# Altium integrated library Altium_WR-TBL_Rising Cage Clamp (rev25a).IntLib: 435 symbols (part 1 of 3) (continued)
## 691221320006 (continued)

## 691221320008
designator J?
WR-TBL Series 2213 55° Entry Modular, THT, pitch 3.81mm, 08p; Manufacturer: Wurth Elektronik; Modularity: Yes; Rated Current: 10A; System: Rising Cage Clamp; Working Voltage: 300V; Manufacturer Part Number: 691221320008; Category: Terminal Block; Match Code: WR-TBL; ComponentLink1Description: Website Link; ComponentLink1URL: https://www.we-online.com/redexpert/article/691221320008?ad; ComponentLink2Description: Datasheet Link; ComponentLink2URL: https://www.we-online.com/redexpert/spec/691221320008?ad; Mount: Through Hole; Min Operating Temperature: -40°C; Max Operating Temperature: 105°C; Packaging: Box; Application: Rising Cage Clamp; Number of Pins: 8; Number of Rows: 1; Orientation: 55°; Pitch: 3.81mm
footprint 691221320008
pins: 1, 2, 3, 4, 5, 6, 7, 8

## 691230110004
designator J?
WR-TBL Series 2301 Double Level Horizontal Entry Modular, THT, pitch 3.5mm, 04p; Manufacturer: Wurth Elektronik; Modularity: Yes; Rated Current: 10A; System: Rising Cage Clamp; Working Voltage: 300V; Manufacturer Part Number: 691230110004; Category: Terminal Block; Match Code: WR-TBL; ComponentLink1Description: Website Link; ComponentLink1URL: https://www.we-online.com/redexpert/article/691230110004?ad; ComponentLink2Description: Datasheet Link; ComponentLink2URL: https://www.we-online.com/redexpert/spec/691230110004?ad; Mount: Through Hole; Min Operating Temperature: -40°C; Max Operating Temperature: 105°C; Packaging: Box; Application: Rising Cage Clamp; Number of Pins: 4; Number of Rows: 2; Orientation: Double Level Horizontal; Pitch: 3.5mm
footprint 691230110004
pins: 1, 2, 3, 4

## 691230110006
designator J?
WR-TBL Series 2301 Double Level Horizontal Entry Modular, THT, pitch 3.5mm, 06p; Manufacturer: Wurth Elektronik; Modularity: Yes; Rated Current: 10A; System: Rising Cage Clamp; Working Voltage: 300V; Manufacturer Part Number: 691230110006; Category: Terminal Block; Match Code: WR-TBL; ComponentLink1Description: Website Link; ComponentLink1URL: https://www.we-online.com/redexpert/article/691230110006?ad; ComponentLink2Description: Datasheet Link; ComponentLink2URL: https://www.we-online.com/redexpert/spec/691230110006?ad; Mount: Through Hole; Min Operating Temperature: -40°C; Max Operating Temperature: 105°C; Packaging: Box; Application: Rising Cage Clamp; Number of Pins: 6; Number of Rows: 2; Orientation: Double Level Horizontal; Pitch: 3.5mm
footprint 691230110006
pins: 1, 2, 3, 4, 5, 6

## 691230310004
designator J?
WR-TBL Series 2303 Double Level Horizontal Entry Modular, THT, pitch 3.81mm, 04p; Manufacturer: Wurth Elektronik; Modularity: Yes; Rated Current: 10A; System: Rising Cage Clamp; Working Voltage: 300V; Manufacturer Part Number: 691230310004; Category: Terminal Block; Match Code: WR-TBL; ComponentLink1Description: Website Link; ComponentLink1URL: https://www.we-online.com/redexpert/article/691230310004?ad; ComponentLink2Description: Datasheet Link; ComponentLink2URL: https://www.we-online.com/redexpert/spec/691230310004?ad; Mount: Through Hole; Min Operating Temperature: -40°C; Max Operating Temperature: 105°C; Packaging: Box; Application: Rising Cage Clamp; Number of Pins: 4; Number of Rows: 2; Orientation: Double Level Horizontal; Pitch: 3.81mm
footprint 691230310004
pins: 1, 2, 3, 4

## 691230310006
designator J?
WR-TBL Series 2303 Double Level Horizontal Entry Modular, THT, pitch 3.81mm, 06p; Manufacturer: Wurth Elektronik; Modularity: Yes; Rated Current: 10A; System: Rising Cage Clamp; Working Voltage: 300V; Manufacturer Part Number: 691230310006; Category: Terminal Block; Match Code: WR-TBL; ComponentLink1Description: Website Link; ComponentLink1URL: https://www.we-online.com/redexpert/article/691230310006?ad; ComponentLink2Description: Datasheet Link; ComponentLink2URL: https://www.we-online.com/redexpert/spec/691230310006?ad; Mount: Through Hole; Min Operating Temperature: -40°C; Max Operating Temperature: 105°C; Packaging: Box; Application: Rising Cage Clamp; Number of Pins: 6; Number of Rows: 2; Orientation: Double Level Horizontal; Pitch: 3.81mm
footprint 691230310006
pins: 1, 2, 3, 4, 5, 6

## 691231510004
designator J?
WR-TBL Series 2315 Double Level Horizontal Entry Modular, THT, pitch 5.08mm, 04p; Manufacturer: Wurth Elektronik; Modularity: Yes; Rated Current: 10A; System: Rising Cage Clamp; Working Voltage: 300V; Manufacturer Part Number: 691231510004; Category: Terminal Block; Match Code: WR-TBL; ComponentLink1Description: Website Link; ComponentLink1URL: https://www.we-online.com/redexpert/article/691231510004?ad; ComponentLink2Description: Datasheet Link; ComponentLink2URL: https://www.we-online.com/redexpert/spec/691231510004?ad; Mount: Through Hole; Min Operating Temperature: -40°C; Max Operating Temperature: 105°C; Packaging: Box; Application: Rising Cage Clamp; Number of Pins: 4; Number of Rows: 2; Orientation: Double Level Horizontal; Pitch: 5.08mm
footprint 691231510004
pins: 1, 2, 3, 4

## 691231510006
designator J?
WR-TBL Series 2315 Double Level Horizontal Entry Modular, THT, pitch 5.08mm, 06p; Manufacturer: Wurth Elektronik; Modularity: Yes; Rated Current: 10A; System: Rising Cage Clamp; Working Voltage: 300V; Manufacturer Part Number: 691231510006; Category: Terminal Block; Match Code: WR-TBL; ComponentLink1Description: Website Link; ComponentLink1URL: https://www.we-online.com/redexpert/article/691231510006?ad; ComponentLink2Description: Datasheet Link; ComponentLink2URL: https://www.we-online.com/redexpert/spec/691231510006?ad; Mount: Through Hole; Min Operating Temperature: -40°C; Max Operating Temperature: 105°C; Packaging: Box; Application: Rising Cage Clamp; Number of Pins: 6; Number of Rows: 2; Orientation: Double Level Horizontal; Pitch: 5.08mm
footprint 691231510006
pins: 1, 2, 3, 4, 5, 6

## 691231710004
designator J?
WR-TBL Series 2317 Double Level Horizontal Entry Modular, THT, pitch 5mm, 04p; Manufacturer: Wurth Elektronik; Modularity: Yes; Rated Current: 10A; System: Rising Cage Clamp; Working Voltage: 300V; Manufacturer Part Number: 691231710004; Category: Terminal Block; Match Code: WR-TBL; ComponentLink1Description: Website Link; ComponentLink1URL: https://www.we-online.com/redexpert/article/691231710004?ad; ComponentLink2Description: Datasheet Link; ComponentLink2URL: https://www.we-online.com/redexpert/spec/691231710004?ad; Mount: Through Hole; Min Operating Temperature: -40°C; Max Operating Temperature: 105°C; Packaging: Box; Application: Rising Cage Clamp; Number of Pins: 4; Number of Rows: 2; Orientation: Double Level Horizontal; Pitch: 5mm
footprint 691231710004
pins: 1, 2, 3, 4

## 691231710006
designator J?
WR-TBL Series 2317 Double Level Horizontal Entry Modular, THT, pitch 5mm, 06p; Manufacturer: Wurth Elektronik; Modularity: Yes; Rated Current: 10A; System: Rising Cage Clamp; Working Voltage: 300V; Manufacturer Part Number: 691231710006; Category: Terminal Block; Match Code: WR-TBL; ComponentLink1Description: Website Link; ComponentLink1URL: https://www.we-online.com/redexpert/article/691231710006?ad; ComponentLink2Description: Datasheet Link; ComponentLink2URL: https://www.we-online.com/redexpert/spec/691231710006?ad; Mount: Through Hole; Min Operating Temperature: -40°C; Max Operating Temperature: 105°C; Packaging: Box; Application: Rising Cage Clamp; Number of Pins: 6; Number of Rows: 2; Orientation: Double Level Horizontal; Pitch: 5mm
footprint 691231710006
pins: 1, 2, 3, 4, 5, 6

## 691232510004
designator J?
WR-TBL Series 2325 Double Level Horizontal Entry Modular, THT, pitch 5.08mm, 04p; Manufacturer: Wurth Elektronik; Modularity: Yes; Rated Current: 20A; System: Rising Cage Clamp; Working Voltage: 300V; Manufacturer Part Number: 691232510004; Category: Terminal Block; Match Code: WR-TBL; ComponentLink1Description: Website Link; ComponentLink1URL: https://www.we-online.com/redexpert/article/691232510004?ad; ComponentLink2Description: Datasheet Link; ComponentLink2URL: https://www.we-online.com/redexpert/spec/691232510004?ad; Mount: Through Hole; Min Operating Temperature: -40°C; Max Operating Temperature: 105°C; Packaging: Box; Application: Rising Cage Clamp; Number of Pins: 4; Number of Rows: 2; Orientation: Double Level Horizontal; Pitch: 5.08mm
footprint 691232510004
pins: 1, 2, 3, 4

## 691232510006
designator J?
WR-TBL Series 2325 Double Level Horizontal Entry Modular, THT, pitch 5.08mm, 06p; Manufacturer: Wurth Elektronik; Modularity: Yes; Rated Current: 20A; System: Rising Cage Clamp; Working Voltage: 300V; Manufacturer Part Number: 691232510006; Category: Terminal Block; Match Code: WR-TBL; ComponentLink1Description: Website Link; ComponentLink1URL: https://www.we-online.com/redexpert/article/691232510006?ad; ComponentLink2Description: Datasheet Link; ComponentLink2URL: https://www.we-online.com/redexpert/spec/691232510006?ad; Mount: Through Hole; Min Operating Temperature: -40°C; Max Operating Temperature: 105°C; Packaging: Box; Application: Rising Cage Clamp; Number of Pins: 6; Number of Rows: 2; Orientation: Double Level Horizontal; Pitch: 5.08mm
footprint 691232510006
pins: 1, 2, 3, 4, 5, 6

## 691232710004
designator J?
WR-TBL Series 2327 Double Level Horizontal Entry Modular, THT, pitch 5mm, 04p; Manufacturer: Wurth Elektronik; Modularity: Yes; Rated Current: 20A; System: Rising Cage Clamp; Working Voltage: 300V; Manufacturer Part Number: 691232710004; Category: Terminal Block; Match Code: WR-TBL; ComponentLink1Description: Website Link; ComponentLink1URL: https://www.we-online.com/redexpert/article/691232710004?ad; ComponentLink2Description: Datasheet Link; ComponentLink2URL: https://www.we-online.com/redexpert/spec/691232710004?ad; Mount: Through Hole; Min Operating Temperature: -40°C; Max Operating Temperature: 105°C; Packaging: Box; Application: Rising Cage Clamp; Number of Pins: 4; Number of Rows: 2; Orientation: Double Level Horizontal; Pitch: 5mm
footprint 691232710004
pins: 1, 2, 3, 4

## 691232710006
designator J?
WR-TBL Series 2327 Double Level Horizontal Entry Modular, THT, pitch 5mm, 06p; Manufacturer: Wurth Elektronik; Modularity: Yes; Rated Current: 20A; System: Rising Cage Clamp; Working Voltage: 300V; Manufacturer Part Number: 691232710006; Category: Terminal Block; Match Code: WR-TBL; ComponentLink1Description: Website Link; ComponentLink1URL: https://www.we-online.com/redexpert/article/691232710006?ad; ComponentLink2Description: Datasheet Link; ComponentLink2URL: https://www.we-online.com/redexpert/spec/691232710006?ad; Mount: Through Hole; Min Operating Temperature: -40°C; Max Operating Temperature: 105°C; Packaging: Box; Application: Rising Cage Clamp; Number of Pins: 6; Number of Rows: 2; Orientation: Double Level Horizontal; Pitch: 5mm
footprint 691232710006
pins: 1, 2, 3, 4, 5, 6

## 691233510004
designator J?
WR-TBL Series 2335 Double Level Horizontal Entry Modular, THT, pitch 5.08mm, 04p; Manufacturer: Wurth Elektronik; Modularity: Yes; Rated Current: 20A; System: Rising Cage Clamp; Working Voltage: 300V; Manufacturer Part Number: 691233510004; Category: Terminal Block; Match Code: WR-TBL; ComponentLink1Description: Website Link; ComponentLink1URL: https://www.we-online.com/redexpert/article/691233510004?ad; ComponentLink2Description: Datasheet Link; ComponentLink2URL: https://www.we-online.com/redexpert/spec/691233510004?ad; Mount: Through Hole; Min Operating Temperature: -40°C; Max Operating Temperature: 105°C; Packaging: Box; Application: Rising Cage Clamp; Number of Pins: 4; Number of Rows: 2; Orientation: Double Level Horizontal; Pitch: 5.08mm
footprint 691233510004
pins: 1, 2, 3, 4

## 691233510004S
designator J?
WR-TBL Series 2335S Double Level Horizontal Entry Modular, THT, pitch 5.08mm, 04p; Manufacturer: Wurth Elektronik; Modularity: Yes; Rated Current: 20A; System: Rising Cage Clamp; Working Voltage: 300V; Manufacturer Part Number: 691233510004S; Category: Terminal Block; Match Code: WR-TBL; ComponentLink1Description: Website Link; ComponentLink1URL: https://www.we-online.com/redexpert/article/691233510004S?ad; ComponentLink2Description: Datasheet Link; ComponentLink2URL: https://www.we-online.com/redexpert/spec/691233510004S?ad; Mount: Through Hole; Min Operating Temperature: -30°C; Max Operating Temperature: 120°C; Packaging: Box; Application: Rising Cage Clamp; Number of Pins: 4; Number of Rows: 2; Orientation: Double Level Horizontal; Pitch: 5.08mm
footprint 691233510004S
pins: 1, 2, 3, 4

## 691233510006
designator J?
WR-TBL Series 2335 Double Level Horizontal Entry Modular, THT, pitch 5.08mm, 06p; Manufacturer: Wurth Elektronik; Modularity: Yes; Rated Current: 20A; System: Rising Cage Clamp; Working Voltage: 300V; Manufacturer Part Number: 691233510006; Category: Terminal Block; Match Code: WR-TBL; ComponentLink1Description: Website Link; ComponentLink1URL: https://www.we-online.com/redexpert/article/691233510006?ad; ComponentLink2Description: Datasheet Link; ComponentLink2URL: https://www.we-online.com/redexpert/spec/691233510006?ad; Mount: Through Hole; Min Operating Temperature: -40°C; Max Operating Temperature: 105°C; Packaging: Box; Application: Rising Cage Clamp; Number of Pins: 6; Number of Rows: 2; Orientation: Double Level Horizontal; Pitch: 5.08mm
footprint 691233510006
pins: 1, 2, 3, 4, 5, 6

## 691233510006S
designator J?
WR-TBL Series 2335S Double Level Horizontal Entry Modular, THT, pitch 5.08mm, 06p; Manufacturer: Wurth Elektronik; Modularity: Yes; Rated Current: 20A; System: Rising Cage Clamp; Working Voltage: 300V; Manufacturer Part Number: 691233510006S; Category: Terminal Block; Match Code: WR-TBL; ComponentLink1Description: Website Link; ComponentLink1URL: https://www.we-online.com/redexpert/article/691233510006S?ad; ComponentLink2Description: Datasheet Link; ComponentLink2URL: https://www.we-online.com/redexpert/spec/691233510006S?ad; Mount: Through Hole; Min Operating Temperature: -30°C; Max Operating Temperature: 120°C; Packaging: Box; Application: Rising Cage Clamp; Number of Pins: 6; Number of Rows: 2; Orientation: Double Level Horizontal; Pitch: 5.08mm
footprint 691233510006S
pins: 1, 2, 3, 4, 5, 6

## 691233610002
designator J?
WR-TBL Series 2336 Double Level Horizontal Entry, THT, pitch 10.16mm, 02p; Manufacturer: Wurth Elektronik; Modularity: Yes; Rated Current: 20A; System: Rising Cage Clamp; Working Voltage: 300V; Manufacturer Part Number: 691233610002; Category: Terminal Block; Match Code: WR-TBL; ComponentLink1Description: Website Link; ComponentLink1URL: https://www.we-online.com/redexpert/article/691233610002?ad; ComponentLink2Description: Datasheet Link; ComponentLink2URL: https://www.we-online.com/redexpert/spec/691233610002?ad; Mount: Through Hole; Min Operating Temperature: -30°C; Max Operating Temperature: 120°C; Packaging: Box; Application: Rising Cage Clamp; Number of Pins: 2; Number of Rows: 2; Orientation: Double Level Horizontal; Pitch: 10.16mm
footprint 691233610002
pins: 1, 2

## 691233610004
designator J?
WR-TBL Series 2336 Double Level Horizontal Entry, THT, pitch 10.16mm, 04p; Manufacturer: Wurth Elektronik; Modularity: Yes; Rated Current: 20A; System: Rising Cage Clamp; Working Voltage: 300V; Manufacturer Part Number: 691233610004; Category: Terminal Block; Match Code: WR-TBL; ComponentLink1Description: Website Link; ComponentLink1URL: https://www.we-online.com/redexpert/article/691233610004?ad; ComponentLink2Description: Datasheet Link; ComponentLink2URL: https://www.we-online.com/redexpert/spec/691233610004?ad; Mount: Through Hole; Min Operating Temperature: -30°C; Max Operating Temperature: 120°C; Packaging: Box; Application: Rising Cage Clamp; Number of Pins: 4; Number of Rows: 2; Orientation: Double Level Horizontal; Pitch: 10.16mm
footprint 691233610004
pins: 1, 2, 3, 4

## 691233610102
designator J?
WR-TBL Series 2336 Double Level Horizontal Entry, THT, pitch 10.16mm, 02p; Manufacturer: Wurth Elektronik; Modularity: Yes; Rated Current: 20A; System: Rising Cage Clamp; Working Voltage: 300V; Manufacturer Part Number: 691233610102; Category: Terminal Block; Match Code: WR-TBL; ComponentLink1Description: Website Link; ComponentLink1URL: https://www.we-online.com/redexpert/article/691233610102?ad; ComponentLink2Description: Datasheet Link; ComponentLink2URL: https://www.we-online.com/redexpert/spec/691233610102?ad; Mount: Through Hole; Min Operating Temperature: -30°C; Max Operating Temperature: 120°C; Packaging: Box; Application: Rising Cage Clamp; Number of Pins: 2; Number of Rows: 2; Orientation: Double Level Horizontal; Pitch: 10.16mm
footprint 691233610102
pins: 1, 2

## 691233710004
designator J?
WR-TBL Series 2337 Double Level Horizontal Entry Modular, THT, pitch 5mm, 04p; Manufacturer: Wurth Elektronik; Modularity: Yes; Rated Current: 20A; System: Rising Cage Clamp; Working Voltage: 300V; Manufacturer Part Number: 691233710004; Category: Terminal Block; Match Code: WR-TBL; ComponentLink1Description: Website Link; ComponentLink1URL: https://www.we-online.com/redexpert/article/691233710004?ad; ComponentLink2Description: Datasheet Link; ComponentLink2URL: https://www.we-online.com/redexpert/spec/691233710004?ad; Mount: Through Hole; Min Operating Temperature: -40°C; Max Operating Temperature: 105°C; Packaging: Box; Application: Rising Cage Clamp; Number of Pins: 4; Number of Rows: 2; Orientation: Double Level Horizontal; Pitch: 5mm
footprint 691233710004
pins: 1, 2, 3, 4

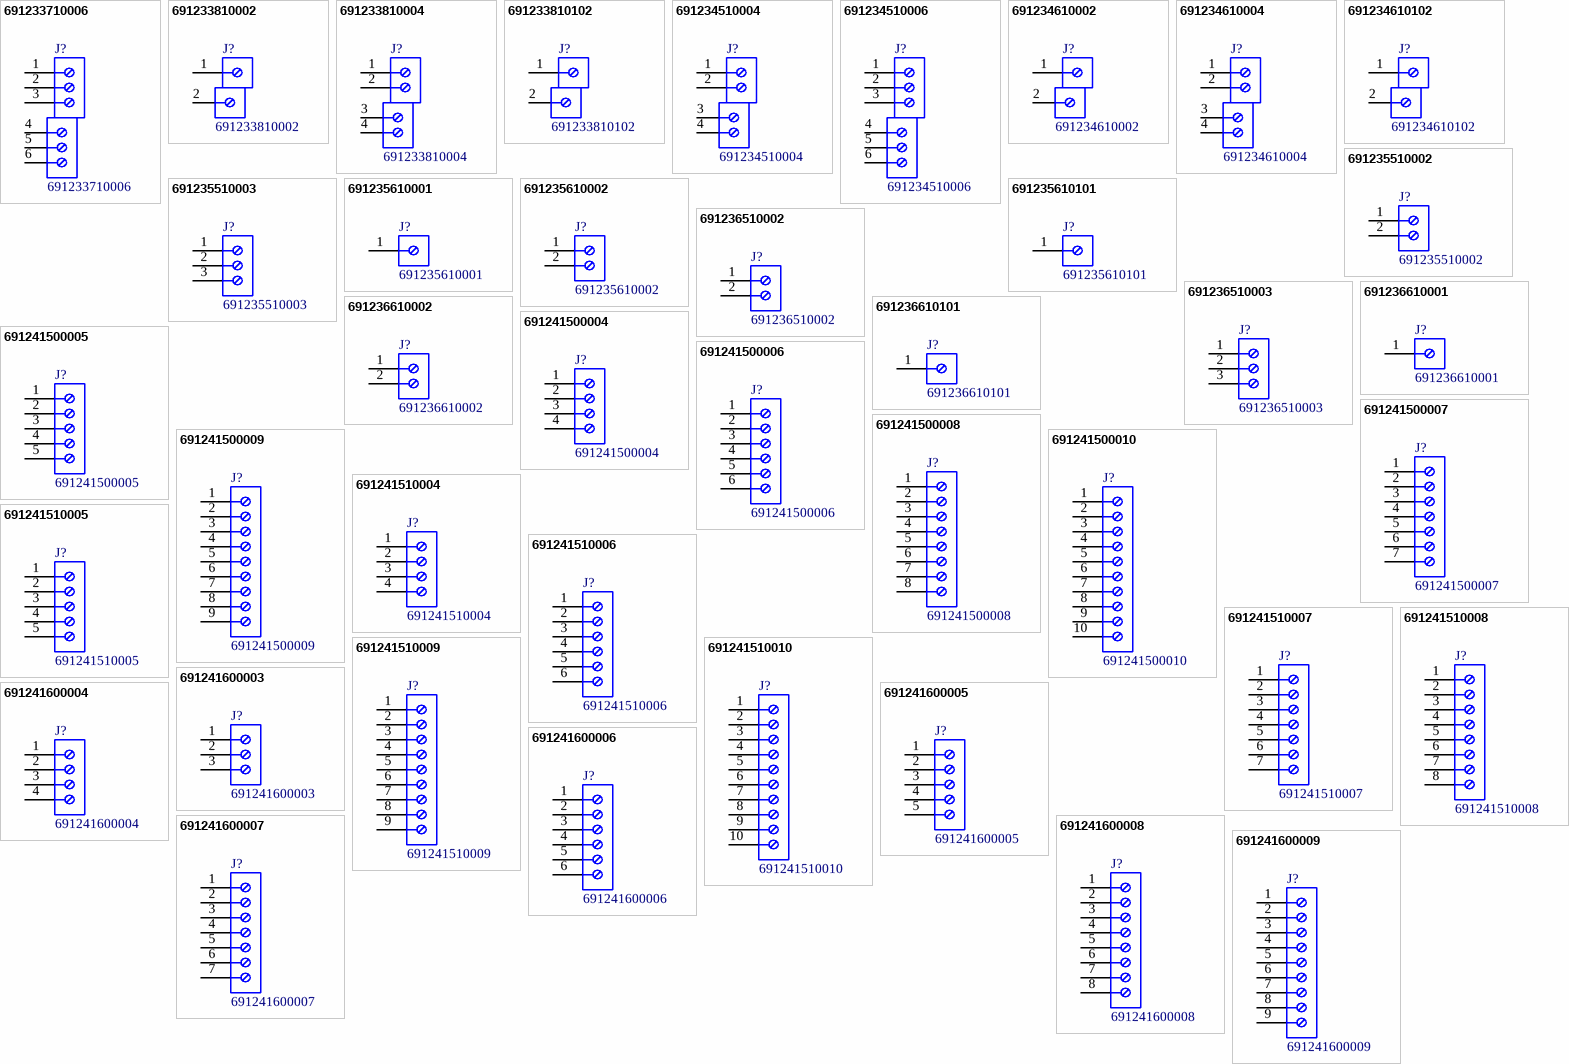
[diagram p3: symbols 691233710006 to 691241600009]

## 691233710006
designator J?
WR-TBL Series 2337 Double Level Horizontal Entry Modular, THT, pitch 5mm, 06p; Manufacturer: Wurth Elektronik; Modularity: Yes; Rated Current: 20A; System: Rising Cage Clamp; Working Voltage: 300V; Manufacturer Part Number: 691233710006; Category: Terminal Block; Match Code: WR-TBL; ComponentLink1Description: Website Link; ComponentLink1URL: https://www.we-online.com/redexpert/article/691233710006?ad; ComponentLink2Description: Datasheet Link; ComponentLink2URL: https://www.we-online.com/redexpert/spec/691233710006?ad; Mount: Through Hole; Min Operating Temperature: -40°C; Max Operating Temperature: 105°C; Packaging: Box; Application: Rising Cage Clamp; Number of Pins: 6; Number of Rows: 2; Orientation: Double Level Horizontal; Pitch: 5mm
footprint 691233710006
pins: 1, 2, 3, 4, 5, 6

## 691233810002
designator J?
WR-TBL Series 2338 Double Level Horizontal Cable Entry, THT, pitch 10mm, 02p; Manufacturer: Wurth Elektronik; Modularity: Yes; Rated Current: 16A; System: Rising Cage Clamp; Working Voltage: 300V; Manufacturer Part Number: 691233810002; Category: Terminal Block; Match Code: WR-TBL; ComponentLink1Description: Website Link; ComponentLink1URL: https://www.we-online.com/redexpert/article/691233810002?ad; ComponentLink2Description: Datasheet Link; ComponentLink2URL: https://www.we-online.com/redexpert/spec/691233810002?ad; Mount: Through Hole; Min Operating Temperature: -30°C; Max Operating Temperature: 120°C; Packaging: Box; Application: Rising Cage Clamp; Number of Pins: 2; Number of Rows: 2; Orientation: Double Level Horizontal; Pitch: 10mm
footprint 691233810002
pins: 1, 2

## 691233810004
designator J?
WR-TBL Series 2338 Double Level Horizontal Cable Entry, THT, pitch 10mm, 04p; Manufacturer: Wurth Elektronik; Modularity: Yes; Rated Current: 16A; System: Rising Cage Clamp; Working Voltage: 300V; Manufacturer Part Number: 691233810004; Category: Terminal Block; Match Code: WR-TBL; ComponentLink1Description: Website Link; ComponentLink1URL: https://www.we-online.com/redexpert/article/691233810004?ad; ComponentLink2Description: Datasheet Link; ComponentLink2URL: https://www.we-online.com/redexpert/spec/691233810004?ad; Mount: Through Hole; Min Operating Temperature: -30°C; Max Operating Temperature: 120°C; Packaging: Box; Application: Rising Cage Clamp; Number of Pins: 4; Number of Rows: 2; Orientation: Double Level Horizontal; Pitch: 10mm
footprint 691233810004
pins: 1, 2, 3, 4

## 691233810102
designator J?
WR-TBL Series 2338 Double Level Horizontal Cable Entry, THT, pitch 10mm, 02p; Manufacturer: Wurth Elektronik; Modularity: Yes; Rated Current: 16A; System: Rising Cage Clamp; Working Voltage: 300V; Manufacturer Part Number: 691233810102; Category: Terminal Block; Match Code: WR-TBL; ComponentLink1Description: Website Link; ComponentLink1URL: https://www.we-online.com/redexpert/article/691233810102?ad; ComponentLink2Description: Datasheet Link; ComponentLink2URL: https://www.we-online.com/redexpert/spec/691233810102?ad; Mount: Through Hole; Min Operating Temperature: -30°C; Max Operating Temperature: 120°C; Packaging: Box; Application: Rising Cage Clamp; Number of Pins: 2; Number of Rows: 2; Orientation: Double Level Horizontal; Pitch: 10mm
footprint 691233810102
pins: 1, 2

## 691234510004
designator J?
WR-TBL Series 2345 Double Level Horizontal Entry, THT, pitch 5.08mm, 04p; Manufacturer: Wurth Elektronik; Modularity: Yes; Rated Current: 20A; System: Rising Cage Clamp; Working Voltage: 300V; Manufacturer Part Number: 691234510004; Category: Terminal Block; Match Code: WR-TBL; ComponentLink1Description: Website Link; ComponentLink1URL: https://www.we-online.com/redexpert/article/691234510004?ad; ComponentLink2Description: Datasheet Link; ComponentLink2URL: https://www.we-online.com/redexpert/spec/691234510004?ad; Mount: Through Hole; Min Operating Temperature: -30°C; Max Operating Temperature: 120°C; Packaging: Box; Application: Rising Cage Clamp; Number of Pins: 4; Number of Rows: 2; Orientation: Double Level Horizontal; Pitch: 5.08mm
footprint 691234510004
pins: 1, 2, 3, 4

## 691234510006
designator J?
WR-TBL Series 2345 Double Level Horizontal Entry, THT, pitch 5.08mm, 06p; Manufacturer: Wurth Elektronik; Modularity: Yes; Rated Current: 20A; System: Rising Cage Clamp; Working Voltage: 300V; Manufacturer Part Number: 691234510006; Category: Terminal Block; Match Code: WR-TBL; ComponentLink1Description: Website Link; ComponentLink1URL: https://www.we-online.com/redexpert/article/691234510006?ad; ComponentLink2Description: Datasheet Link; ComponentLink2URL: https://www.we-online.com/redexpert/spec/691234510006?ad; Mount: Through Hole; Min Operating Temperature: -30°C; Max Operating Temperature: 120°C; Packaging: Box; Application: Rising Cage Clamp; Number of Pins: 6; Number of Rows: 2; Orientation: Double Level Horizontal; Pitch: 5.08mm
footprint 691234510006
pins: 1, 2, 3, 4, 5, 6

## 691234610002
designator J?
WR-TBL Series 2346 Double Level Horizontal Entry, THT, pitch 10.16mm, 02p; Manufacturer: Wurth Elektronik; Modularity: Yes; Rated Current: 20A; System: Rising Cage Clamp; Working Voltage: 300V; Manufacturer Part Number: 691234610002; Category: Terminal Block; Match Code: WR-TBL; ComponentLink1Description: Website Link; ComponentLink1URL: https://www.we-online.com/redexpert/article/691234610002?ad; ComponentLink2Description: Datasheet Link; ComponentLink2URL: https://www.we-online.com/redexpert/spec/691234610002?ad; Mount: Through Hole; Min Operating Temperature: -30°C; Max Operating Temperature: 120°C; Packaging: Box; Application: Rising Cage Clamp; Number of Pins: 2; Number of Rows: 2; Orientation: Double Level Horizontal; Pitch: 10.16mm
footprint 691234610002
pins: 1, 2

## 691234610004
designator J?
WR-TBL Series 2346 Double Level Horizontal Entry, THT, pitch 10.16mm, 04p; Manufacturer: Wurth Elektronik; Modularity: Yes; Rated Current: 20A; System: Rising Cage Clamp; Working Voltage: 300V; Manufacturer Part Number: 691234610004; Category: Terminal Block; Match Code: WR-TBL; ComponentLink1Description: Website Link; ComponentLink1URL: https://www.we-online.com/redexpert/article/691234610004?ad; ComponentLink2Description: Datasheet Link; ComponentLink2URL: https://www.we-online.com/redexpert/spec/691234610004?ad; Mount: Through Hole; Min Operating Temperature: -30°C; Max Operating Temperature: 120°C; Packaging: Box; Application: Rising Cage Clamp; Number of Pins: 4; Number of Rows: 2; Orientation: Double Level Horizontal; Pitch: 10.16mm
footprint 691234610004
pins: 1, 2, 3, 4

## 691234610102
designator J?
WR-TBL Series 2346 Double Level Horizontal Entry, THT, pitch 10.16mm, 02p; Manufacturer: Wurth Elektronik; Modularity: Yes; Rated Current: 20A; System: Rising Cage Clamp; Working Voltage: 300V; Manufacturer Part Number: 691234610102; Category: Terminal Block; Match Code: WR-TBL; ComponentLink1Description: Website Link; ComponentLink1URL: https://www.we-online.com/redexpert/article/691234610102?ad; ComponentLink2Description: Datasheet Link; ComponentLink2URL: https://www.we-online.com/redexpert/spec/691234610102?ad; Mount: Through Hole; Min Operating Temperature: -30°C; Max Operating Temperature: 120°C; Packaging: Box; Application: Rising Cage Clamp; Number of Pins: 2; Number of Rows: 2; Orientation: Double Level Horizontal; Pitch: 10.16mm
footprint 691234610102
pins: 1, 2

## 691235510002
designator J?
WR-TBL Series 2355 Horizontal Entry, THT, pitch 5.08mm, 02p; Manufacturer: Wurth Elektronik; Modularity: Yes; Rated Current: 20A; System: Rising Cage Clamp; Working Voltage: 300V; Manufacturer Part Number: 691235510002; Category: Terminal Block; Match Code: WR-TBL; ComponentLink1Description: Website Link; ComponentLink1URL: https://www.we-online.com/redexpert/article/691235510002?ad; ComponentLink2Description: Datasheet Link; ComponentLink2URL: https://www.we-online.com/redexpert/spec/691235510002?ad; Mount: Through Hole; Min Operating Temperature: -30°C; Max Operating Temperature: 120°C; Packaging: Box; Application: Rising Cage Clamp; Number of Pins: 2; Number of Rows: 1; Orientation: Horizontal; Pitch: 5.08mm
footprint 691235510002
pins: 1, 2

## 691235510003
designator J?
WR-TBL Series 2355 Horizontal Entry, THT, pitch 5.08mm, 03p; Manufacturer: Wurth Elektronik; Modularity: Yes; Rated Current: 20A; System: Rising Cage Clamp; Working Voltage: 300V; Manufacturer Part Number: 691235510003; Category: Terminal Block; Match Code: WR-TBL; ComponentLink1Description: Website Link; ComponentLink1URL: https://www.we-online.com/redexpert/article/691235510003?ad; ComponentLink2Description: Datasheet Link; ComponentLink2URL: https://www.we-online.com/redexpert/spec/691235510003?ad; Mount: Through Hole; Min Operating Temperature: -30°C; Max Operating Temperature: 120°C; Packaging: Box; Application: Rising Cage Clamp; Number of Pins: 3; Number of Rows: 1; Orientation: Horizontal; Pitch: 5.08mm
footprint 691235510003
pins: 1, 2, 3

## 691235610001
designator J?
WR-TBL Series 2356 Horizontal Entry, THT, pitch 10.16mm, 01p; Manufacturer: Wurth Elektronik; Modularity: Yes; Rated Current: 20A; System: Rising Cage Clamp; Working Voltage: 300V; Manufacturer Part Number: 691235610001; Category: Terminal Block; Match Code: WR-TBL; ComponentLink1Description: Website Link; ComponentLink1URL: https://www.we-online.com/redexpert/article/691235610001?ad; ComponentLink2Description: Datasheet Link; ComponentLink2URL: https://www.we-online.com/redexpert/spec/691235610001?ad; Mount: Through Hole; Min Operating Temperature: -30°C; Max Operating Temperature: 120°C; Packaging: Box; Application: Rising Cage Clamp; Number of Pins: 1; Number of Rows: 1; Orientation: Horizontal; Pitch: 10.16mm
footprint 691235610001
pins: 1

## 691235610002
designator J?
WR-TBL Series 2356 Horizontal Entry, THT, pitch 10.16mm, 02p; Manufacturer: Wurth Elektronik; Modularity: Yes; Rated Current: 20A; System: Rising Cage Clamp; Working Voltage: 300V; Manufacturer Part Number: 691235610002; Category: Terminal Block; Match Code: WR-TBL; ComponentLink1Description: Website Link; ComponentLink1URL: https://www.we-online.com/redexpert/article/691235610002?ad; ComponentLink2Description: Datasheet Link; ComponentLink2URL: https://www.we-online.com/redexpert/spec/691235610002?ad; Mount: Through Hole; Min Operating Temperature: -30°C; Max Operating Temperature: 120°C; Packaging: Box; Application: Rising Cage Clamp; Number of Pins: 2; Number of Rows: 1; Orientation: Horizontal; Pitch: 10.16mm
footprint 691235610002
pins: 1, 2

## 691235610101
designator J?
WR-TBL Series 2356 Horizontal Entry, THT, pitch 10.16mm, 01p; Manufacturer: Wurth Elektronik; Modularity: Yes; Rated Current: 20A; System: Rising Cage Clamp; Working Voltage: 300V; Manufacturer Part Number: 691235610101; Category: Terminal Block; Match Code: WR-TBL; ComponentLink1Description: Website Link; ComponentLink1URL: https://www.we-online.com/redexpert/article/691235610101?ad; ComponentLink2Description: Datasheet Link; ComponentLink2URL: https://www.we-online.com/redexpert/spec/691235610101?ad; Mount: Through Hole; Min Operating Temperature: -30°C; Max Operating Temperature: 120°C; Packaging: Box; Application: Rising Cage Clamp; Number of Pins: 1; Number of Rows: 1; Orientation: Horizontal; Pitch: 10.16mm
footprint 691235610101
pins: 1

## 691236510002
designator J?
WR-TBL Series 2365 Horizontal Entry, THT, pitch 5.08mm, 02p; Manufacturer: Wurth Elektronik; Modularity: Yes; Rated Current: 20A; System: Rising Cage Clamp; Working Voltage: 300V; Manufacturer Part Number: 691236510002; Category: Terminal Block; Match Code: WR-TBL; ComponentLink1Description: Website Link; ComponentLink1URL: https://www.we-online.com/redexpert/article/691236510002?ad; ComponentLink2Description: Datasheet Link; ComponentLink2URL: https://www.we-online.com/redexpert/spec/691236510002?ad; Mount: Through Hole; Min Operating Temperature: -30°C; Max Operating Temperature: 120°C; Packaging: Box; Application: Rising Cage Clamp; Number of Pins: 2; Number of Rows: 1; Orientation: Horizontal; Pitch: 5.08mm
footprint 691236510002
pins: 1, 2

## 691236510003
designator J?
WR-TBL Series 2365 Horizontal Entry, THT, pitch 5.08mm, 03p; Manufacturer: Wurth Elektronik; Modularity: Yes; Rated Current: 20A; System: Rising Cage Clamp; Working Voltage: 300V; Manufacturer Part Number: 691236510003; Category: Terminal Block; Match Code: WR-TBL; ComponentLink1Description: Website Link; ComponentLink1URL: https://www.we-online.com/redexpert/article/691236510003?ad; ComponentLink2Description: Datasheet Link; ComponentLink2URL: https://www.we-online.com/redexpert/spec/691236510003?ad; Mount: Through Hole; Min Operating Temperature: -30°C; Max Operating Temperature: 120°C; Packaging: Box; Application: Rising Cage Clamp; Number of Pins: 3; Number of Rows: 1; Orientation: Horizontal; Pitch: 5.08mm
footprint 691236510003
pins: 1, 2, 3

## 691236610001
designator J?
WR-TBL Series 2366 Horizontal Entry, THT, pitch 10.16mm, 01p; Manufacturer: Wurth Elektronik; Modularity: Yes; Rated Current: 20A; System: Rising Cage Clamp; Working Voltage: 300V; Manufacturer Part Number: 691236610001; Category: Terminal Block; Match Code: WR-TBL; ComponentLink1Description: Website Link; ComponentLink1URL: https://www.we-online.com/redexpert/article/691236610001?ad; ComponentLink2Description: Datasheet Link; ComponentLink2URL: https://www.we-online.com/redexpert/spec/691236610001?ad; Mount: Through Hole; Min Operating Temperature: -30°C; Max Operating Temperature: 120°C; Packaging: Box; Application: Rising Cage Clamp; Number of Pins: 1; Number of Rows: 1; Orientation: Horizontal; Pitch: 10.16mm
footprint 691236610001
pins: 1

## 691236610002
designator J?
WR-TBL Series 2366 Horizontal Entry, THT, pitch 10.16mm, 02p; Manufacturer: Wurth Elektronik; Modularity: Yes; Rated Current: 20A; System: Rising Cage Clamp; Working Voltage: 300V; Manufacturer Part Number: 691236610002; Category: Terminal Block; Match Code: WR-TBL; ComponentLink1Description: Website Link; ComponentLink1URL: https://www.we-online.com/redexpert/article/691236610002?ad; ComponentLink2Description: Datasheet Link; ComponentLink2URL: https://www.we-online.com/redexpert/spec/691236610002?ad; Mount: Through Hole; Min Operating Temperature: -30°C; Max Operating Temperature: 120°C; Packaging: Box; Application: Rising Cage Clamp; Number of Pins: 2; Number of Rows: 1; Orientation: Horizontal; Pitch: 10.16mm
footprint 691236610002
pins: 1, 2

## 691236610101
designator J?
WR-TBL Series 2366 Horizontal Entry, THT, pitch 10.16mm, 01p; Manufacturer: Wurth Elektronik; Modularity: Yes; Rated Current: 20A; System: Rising Cage Clamp; Working Voltage: 300V; Manufacturer Part Number: 691236610101; Category: Terminal Block; Match Code: WR-TBL; ComponentLink1Description: Website Link; ComponentLink1URL: https://www.we-online.com/redexpert/article/691236610101?ad; ComponentLink2Description: Datasheet Link; ComponentLink2URL: https://www.we-online.com/redexpert/spec/691236610101?ad; Mount: Through Hole; Min Operating Temperature: -30°C; Max Operating Temperature: 120°C; Packaging: Box; Application: Rising Cage Clamp; Number of Pins: 1; Number of Rows: 1; Orientation: Horizontal; Pitch: 10.16mm
footprint 691236610101
pins: 1

## 691241500004
designator J?
WR-TBL Series 2415 Vertical Entry, THT, pitch 5.08mm, 04p; Manufacturer: Wurth Elektronik; Modularity: No; Rated Current: 14A; System: Rising Cage Clamp; Working Voltage: 300V; Manufacturer Part Number: 691241500004; Category: Terminal Block; Match Code: WR-TBL; ComponentLink1Description: Website Link; ComponentLink1URL: https://www.we-online.com/redexpert/article/691241500004?ad; ComponentLink2Description: Datasheet Link; ComponentLink2URL: https://www.we-online.com/redexpert/spec/691241500004?ad; Mount: Through Hole; Min Operating Temperature: -30°C; Max Operating Temperature: 120°C; Packaging: Box; Application: Rising Cage Clamp; Number of Pins: 4; Number of Rows: 1; Orientation: Vertical; Pitch: 5.08mm
footprint 691241500004
pins: 1, 2, 3, 4

## 691241500005
designator J?
WR-TBL Series 2415 Vertical Entry, THT, pitch 5.08mm, 05p; Manufacturer: Wurth Elektronik; Modularity: No; Rated Current: 14A; System: Rising Cage Clamp; Working Voltage: 300V; Manufacturer Part Number: 691241500005; Category: Terminal Block; Match Code: WR-TBL; ComponentLink1Description: Website Link; ComponentLink1URL: https://www.we-online.com/redexpert/article/691241500005?ad; ComponentLink2Description: Datasheet Link; ComponentLink2URL: https://www.we-online.com/redexpert/spec/691241500005?ad; Mount: Through Hole; Min Operating Temperature: -30°C; Max Operating Temperature: 120°C; Packaging: Box; Application: Rising Cage Clamp; Number of Pins: 5; Number of Rows: 1; Orientation: Vertical; Pitch: 5.08mm
footprint 691241500005
pins: 1, 2, 3, 4, 5

## 691241500006
designator J?
WR-TBL Series 2415 Vertical Entry, THT, pitch 5.08mm, 06p; Manufacturer: Wurth Elektronik; Modularity: No; Rated Current: 14A; System: Rising Cage Clamp; Working Voltage: 300V; Manufacturer Part Number: 691241500006; Category: Terminal Block; Match Code: WR-TBL; ComponentLink1Description: Website Link; ComponentLink1URL: https://www.we-online.com/redexpert/article/691241500006?ad; ComponentLink2Description: Datasheet Link; ComponentLink2URL: https://www.we-online.com/redexpert/spec/691241500006?ad; Mount: Through Hole; Min Operating Temperature: -30°C; Max Operating Temperature: 120°C; Packaging: Box; Application: Rising Cage Clamp; Number of Pins: 6; Number of Rows: 1; Orientation: Vertical; Pitch: 5.08mm
footprint 691241500006
pins: 1, 2, 3, 4, 5, 6

## 691241500007
designator J?
WR-TBL Series 2415 Vertical Entry, THT, pitch 5.08mm, 07p; Manufacturer: Wurth Elektronik; Modularity: No; Rated Current: 14A; System: Rising Cage Clamp; Working Voltage: 300V; Manufacturer Part Number: 691241500007; Category: Terminal Block; Match Code: WR-TBL; ComponentLink1Description: Website Link; ComponentLink1URL: https://www.we-online.com/redexpert/article/691241500007?ad; ComponentLink2Description: Datasheet Link; ComponentLink2URL: https://www.we-online.com/redexpert/spec/691241500007?ad; Mount: Through Hole; Min Operating Temperature: -30°C; Max Operating Temperature: 120°C; Packaging: Box; Application: Rising Cage Clamp; Number of Pins: 7; Number of Rows: 1; Orientation: Vertical; Pitch: 5.08mm
footprint 691241500007
pins: 1, 2, 3, 4, 5, 6, 7

## 691241500008
designator J?
WR-TBL Series 2415 Vertical Entry, THT, pitch 5.08mm, 08p; Manufacturer: Wurth Elektronik; Modularity: No; Rated Current: 14A; System: Rising Cage Clamp; Working Voltage: 300V; Manufacturer Part Number: 691241500008; Category: Terminal Block; Match Code: WR-TBL; ComponentLink1Description: Website Link; ComponentLink1URL: https://www.we-online.com/redexpert/article/691241500008?ad; ComponentLink2Description: Datasheet Link; ComponentLink2URL: https://www.we-online.com/redexpert/spec/691241500008?ad; Mount: Through Hole; Min Operating Temperature: -30°C; Max Operating Temperature: 120°C; Packaging: Box; Application: Rising Cage Clamp; Number of Pins: 8; Number of Rows: 1; Orientation: Vertical; Pitch: 5.08mm
footprint 691241500008
pins: 1, 2, 3, 4, 5, 6, 7, 8

## 691241500009
designator J?
WR-TBL Series 2415 Vertical Entry, THT, pitch 5.08mm, 09p; Manufacturer: Wurth Elektronik; Modularity: No; Rated Current: 14A; System: Rising Cage Clamp; Working Voltage: 300V; Manufacturer Part Number: 691241500009; Category: Terminal Block; Match Code: WR-TBL; ComponentLink1Description: Website Link; ComponentLink1URL: https://www.we-online.com/redexpert/article/691241500009?ad; ComponentLink2Description: Datasheet Link; ComponentLink2URL: https://www.we-online.com/redexpert/spec/691241500009?ad; Mount: Through Hole; Min Operating Temperature: -30°C; Max Operating Temperature: 120°C; Packaging: Box; Application: Rising Cage Clamp; Number of Pins: 9; Number of Rows: 1; Orientation: Vertical; Pitch: 5.08mm
footprint 691241500009
pins: 1, 2, 3, 4, 5, 6, 7, 8, 9

## 691241500010
designator J?
WR-TBL Series 2415 Vertical Entry, THT, pitch 5.08mm, 10p; Manufacturer: Wurth Elektronik; Modularity: No; Rated Current: 14A; System: Rising Cage Clamp; Working Voltage: 300V; Manufacturer Part Number: 691241500010; Category: Terminal Block; Match Code: WR-TBL; ComponentLink1Description: Website Link; ComponentLink1URL: https://www.we-online.com/redexpert/article/691241500010?ad; ComponentLink2Description: Datasheet Link; ComponentLink2URL: https://www.we-online.com/redexpert/spec/691241500010?ad; Mount: Through Hole; Min Operating Temperature: -30°C; Max Operating Temperature: 120°C; Packaging: Box; Application: Rising Cage Clamp; Number of Pins: 10; Number of Rows: 1; Orientation: Vertical; Pitch: 5.08mm
footprint 691241500010
pins: 1, 2, 3, 4, 5, 6, 7, 8, 9, 10
